# Altium footprint library MyPCBLib.PcbLib: 168 footprints (part 1 of 11)
Each footprint in its own frame and in the unit in brackets; x right, y up, seen from the top. Pads: shape width x height; smd on the part's side, far side on the other; paste and mask are expansions set on the pad; w line width, h text height; cw(c..) or ccw(c..) is an arc to the next point about the centre after c.
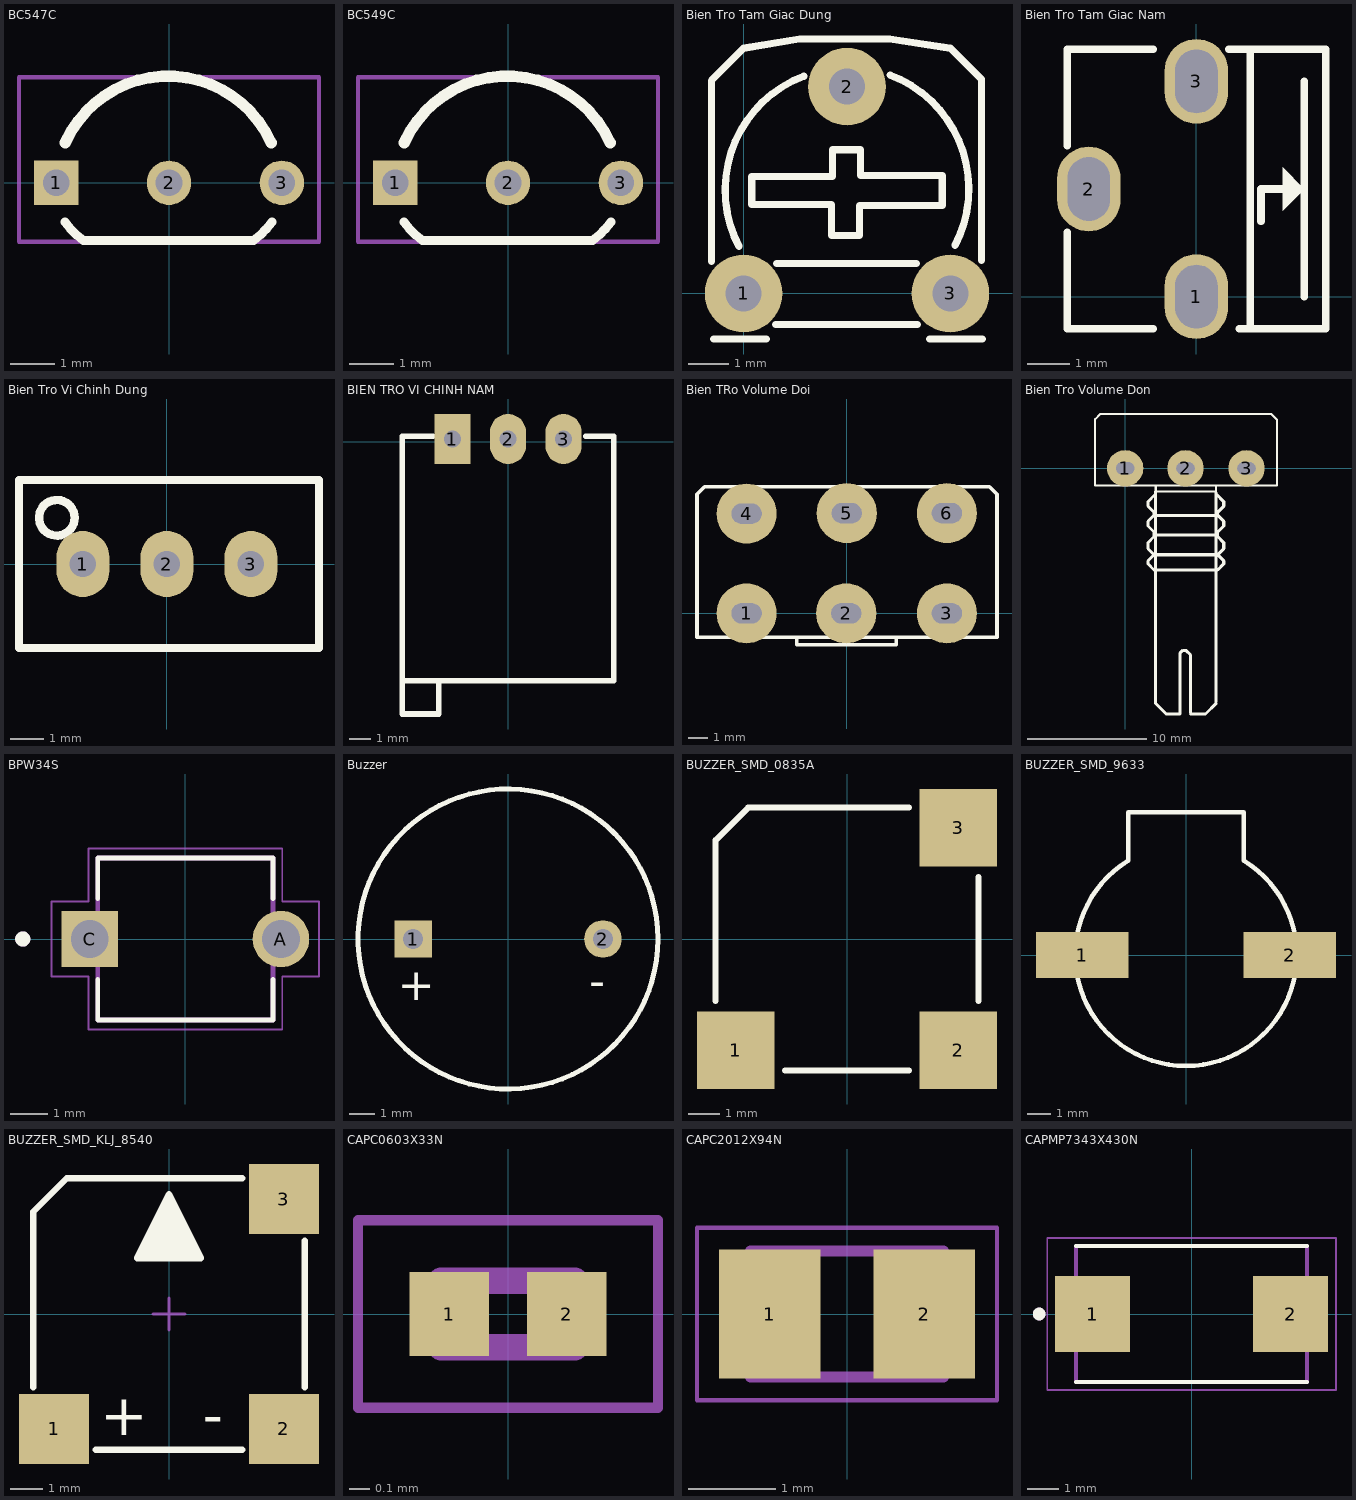
[diagram p0: the footprints below, top view; thin cyan lines are the x and y axes]

## BC547C [mm]
pads (3):
  rect 1x1 hole 0.6: 1(-2.54,0)
  round 1 hole 0.6: 2(0,0) 3(2.54,0)
Top Overlay:
  lines w0.2: -2.342,-0.884 ccw(c-0.93,0.113) -1.925,-1.3 ; -1.9,-1.3 1.9,-1.3 ccw(c0.905,0.113) 2.317,-0.884
  lines w0.254: -2.335,0.9 cw(c-0.017,-0.14) 2.3,0.9
Mechanical 15:
  lines w0.1: -3.377,-1.325 -3.377,2.375 3.377,2.375 3.377,-1.325 -3.377,-1.325
3D body "p210_TO-92.stp": height 8.6, standoff -8.5, extent -2.74,-1.28 2.74,2.32

## BC549C [mm]
pads (3):
  rect 1x1 hole 0.6: 1(-2.54,0)
  round 1 hole 0.6: 2(0,0) 3(2.54,0)
Top Overlay:
  lines w0.2: -2.342,-0.884 ccw(c-0.93,0.113) -1.925,-1.3 ; -1.9,-1.3 1.9,-1.3 ccw(c0.905,0.113) 2.317,-0.884
  lines w0.254: -2.335,0.9 cw(c-0.017,-0.14) 2.3,0.9
Mechanical 15:
  lines w0.1: -3.377,-1.325 -3.377,2.375 3.377,2.375 3.377,-1.325 -3.377,-1.325
3D body "p210_TO-92.stp": height 8.6, standoff -8.5, extent -2.74,-1.3 2.74,2.3

## Bien Tro Tam Giac Dung [mil] "RM065"
height 200
pads (3):
  round 75 hole 35: 1(0,0) 2(100,200) 3(200,0)
Top Overlay:
  lines w7: -31,31 -31,206 0,237 54,246 141.5,246 200,237 230,207 230,32 ; -29,-44 22,-44 ; -4.35,45.34 cw(c100,100) 58.1,210.1 ; 8,113 8,86 85,86 85,56 112,56 112,85 192,85 192,114 113,114 113,139 86,139 86,113 9,113 ; 31,-30 168,-30 ; 32,29 167,29 ; 141.9,211.1 cw(c100,101) 204.35,46.34 ; 180,-44 231,-44
3D body "Bien TroTam Giac.step": height 278.74, standoff -150.39, extent -27.95,-49.68 227.95,227.88

## Bien Tro Tam Giac Nam [mm] "RM063"
pads (3):
  oval 1.5x2 hole 1 slot 1.5 at 90 deg: 1(0,0) 2(-2.54,2.54) 3(0,5.08)
Top Overlay:
  region: 2.032,3.048 2.032,2.032 2.54,2.54
  lines w0.178: -3.048,1.524 -3.048,-0.762 -1.016,-0.762 ; -3.048,3.556 -3.048,5.842 -1.016,5.842 ; 0.762,5.842 3.048,5.842 3.048,-0.762 1.016,-0.762 ; 1.27,-0.762 1.27,5.842 ; 1.524,1.778 1.524,2.54 2.032,2.54 ; 2.54,0 2.54,5.08
3D body "User Library-RM-063.STEP": height 9.5, standoff -1.81, extent -2.683,-0.71 2.946,5.79

## Bien Tro Vi Chinh Dung [mm] "Bien tro vi chinh"
pads (3):
  oval 1.6x2 hole 0.8: 1(-2.54,0) 2(0,0) 3(2.54,0)
Top Overlay:
  circle w0.254: c-3.327,1.397 r0.539
  lines w0.254: -4.47,-2.54 4.597,-2.54 4.597,2.54 -4.47,2.54 -4.47,-2.54
3D body "User Library-Potenciometro Vertical.step": height 12.02, standoff -5.48, extent -4.537,-2.4 4.663,2.4

## BIEN TRO VI CHINH NAM [mil]
pads (3):
  rect 65x90 hole 30: 1(-100,5)
  oval 65x90 hole 30: 2(0,5) 3(100,5)
Top Overlay:
  lines w10: -190,-455 -190,10 -135,10 ; -125,-430 -125,-490 -190,-490 -190,-430 190,-430 190,10 140,10
3D body "SW3dPS-Bourns_3299W.STEP": height 225.6, standoff -14.4, extent -187.5,-490 187.5,10

## Bien TRo Volume Doi [mil] "Volume control Dual"
height 400
pads (6):
  round 120 hole 40 slot 60 at 0 deg: 1(-200,0) 2(-1,0) 3(200,0) 4(-200,199) 5(0,200) 6(200,200)
Top Overlay:
  lines w7: -100,-48 -100,-63 99,-63 99,-48 ; -299,-48 -299,238 -284,253 285,253 300,238 300,-48 -299,-48
3D body "SW3dPS-ALPHA-potentiometer stereo PCB mount.STEP": height 834.65, standoff -129.92, extent -338.65,-1309.27 330.65,299

## Bien Tro Volume Don [mil] "Volume control single"
pads (3):
  round 120 hole 40 slot 60 at 0 deg: 1(0,0) 2(199,0) 3(400,0)
Top Overlay:
  lines w7: 100,-57 100,-77 299,-77 299,-57 ; 101,-77 101,-57 ; -99,-57 -99,162 -82,179 482,179 500,161 500,-57 -99,-57
  lines w10: 95,-335 75,-315 75,-305 95,-285 75,-265 75,-245 95,-225 95,-210 75,-190 75,-175 95,-155 95,-145 75,-125 75,-110 100,-85 ; 95,-220 300,-220 ; 100,-770 100,-77 ; 100,-760 100,-775 135,-810 180,-810 180,-610 190,-600 200,-600 215,-615 215,-805 ; 100,-335 305,-335 325,-315 325,-305 305,-285 ; 100,-285 305,-285 ; 105,-155 300,-155 ; 215,-810 265,-810 300,-775 ; 300,-770 300,-80 ; 300,-85 325,-110 325,-125 305,-145 305,-155 325,-175 325,-190 305,-210 305,-225 325,-245 325,-265 305,-285
3D body "SW3dPS-Pot.STEP": height 839.35, standoff -130, extent -110,-818.11 510,188.11

## BPW34S [mm]
pads (2):
  round 1.5 hole 1: A(2.54,0)
  rect 1.5x1.5 hole 1: C(-2.54,0)
Top Overlay:
  circle w0.2: c-4.318,0 r0.1
  lines w0.127: -2.325,-1.07 -2.325,-2.15 2.325,-2.15 2.325,-1.07 ; -2.325,1.07 -2.325,2.15 2.325,2.15 2.325,1.07
Mechanical 13:
  circle w0.2: c-4.318,0 r0.1
  lines w0.127: -2.325,-2.15 2.325,-2.15 2.325,2.15 -2.325,2.15 -2.325,-2.15
Mechanical 15:
  lines w0.05: -3.55,-1 -2.575,-1 -2.575,-2.4 2.575,-2.4 2.575,-1 3.55,-1 3.55,1 2.575,1 2.575,2.4 -2.575,2.4 -2.575,1 -3.55,1 -3.55,-1
3D body "BPW34--3DModel-STEP-56544.STEP": height 2, standoff -3.5, extent -2.7,-2.15 2.7,2.15

## Buzzer [mm] "2PIN, 3.5mm pitch, 0.8mm pin width"
pads (2):
  rect 1.5x1.5 hole 0.8: 1(-3.8,0)
  round 1.5 hole 0.8: 2(3.8,0)
Top Overlay:
  circle w0.2: c0,0 r6
  text "-" at 3.25,-2.3 h1.3
  text "+" at -4.4,-2.45 h1.3
3D body "SW3dPS-WST-1203UX.STEP": height 9.65, standoff -4.5, extent -6.08,-6.01 9.374,5.99

## BUZZER_SMD_0835A [mm] "Buzzer SMD"
height 3
pads (3):
  rect 2.5x2.5 smd: 1(-3.6,-3.6) 2(3.6,-3.6) 3(3.6,3.6)
Top Overlay:
  lines w0.2: -4.25,-2 -4.25,3.2 -3.2,4.25 2,4.25 ; -2,-4.25 2,-4.25 ; 4.25,-2 4.25,2
3D body: height 3, standoff 0, extent -4.25,-4.255 4.255,4.25

## BUZZER_SMD_9633 [mm] "Capacitor, SM Tantalum; Body 7.3 x 4.3 mm (LxW typ)"
height 3.7
pads (2):
  rect 4x2 smd: 1(-4.5,0) 2(4.5,0)
Top Overlay:
  lines w0.2: -2.5,4.1 -2.5,6.2 2.5,6.2 2.5,4.1 ; -2.499,4.098 ccw(c0,0) 2.499,4.098
3D body "SW3DPS-BUZZER (SPEAKER) SMD-DEFAULT.STEP": height 4, standoff -0.02, extent -6.135,-4.58 6.165,5.57

## BUZZER_SMD_KLJ_8540 [mm] "SMD Buzzer, 5V, Size: 8.5x8.5MM, 2700 Hz"
height 4
pads (3):
  rect 2.2x2.2 smd: 1(-3.6,-3.6) 2(3.6,-3.6) 3(3.6,3.6)
Top Overlay:
  region: -1,1.75 0,3.75 1,1.75
  lines w0.2: -4.25,-2.3 -4.25,3.2 -3.2,4.25 2.3,4.25 ; -2.3,-4.25 2.3,-4.25 ; 4.25,-2.3 4.25,2.3 ; -1,1.75 1,1.75 0,3.75 -1,1.75
  text "+" at -2.15,-3.8 h1.3
  text "-" at 1.05,-3.8 h1.3
Mechanical 15:
  lines w0.1: -0.5,0 0.5,0 ; 0,-0.5 0,0.5
3D body: height 4, standoff 0, extent -4.25,-4.255 4.255,4.25

## CAPC0603X33N [mm]
pads (2):
  rect 0.38x0.4 smd: 1(-0.281,0) 2(0.281,0)
Mechanical 13:
  lines w0.127: -0.32,-0.16 -0.32,0.16 0.32,0.16 0.32,-0.16 -0.32,-0.16
Mechanical 15:
  lines w0.05: -0.718,-0.448 -0.718,0.448 0.718,0.448 0.718,-0.448 -0.718,-0.448

## CAPC2012X94N [mm]
pads (2):
  rect 1.16x1.47 smd: 1(-0.88,0) 2(0.88,0)
Mechanical 13:
  lines w0.127: -1.1,-0.72 -1.1,0.72 1.1,0.72 1.1,-0.72 -1.1,-0.72
Mechanical 15:
  lines w0.05: -1.713,-0.983 -1.713,0.983 1.713,0.983 1.713,-0.983 -1.713,-0.983

## CAPMP7343X430N [mm]
height 4.3
pads (2):
  rect 2.37x2.41 smd: 1(-3.125,0) 2(3.125,0)
Top Overlay:
  circle w0.2: c-4.81,0 r0.1
  lines w0.127: -3.65,-2.15 3.65,-2.15 ; -3.65,2.15 3.65,2.15
Mechanical 13:
  circle w0.2: c-4.81,0 r0.1
  lines w0.127: -3.65,-2.15 3.65,-2.15 3.65,2.15 -3.65,2.15 -3.65,-2.15
Mechanical 15:
  lines w0.05: -4.56,-2.4 4.56,-2.4 4.56,2.4 -4.56,2.4 -4.56,-2.4
3D body "step_temp.STEP": height 4.3, standoff 0, extent -3.65,-2.15 3.65,2.15